# Altium footprint library Conectores GAM.PcbLib: 182 footprints (part 4 of 12)
Each footprint in its own frame and in the unit in brackets; x right, y up, seen from the top. Pads: shape width x height; smd on the part's side, far side on the other; paste and mask are expansions set on the pad; w line width, h text height; cw(c..) or ccw(c..) is an arc to the next point about the centre after c.
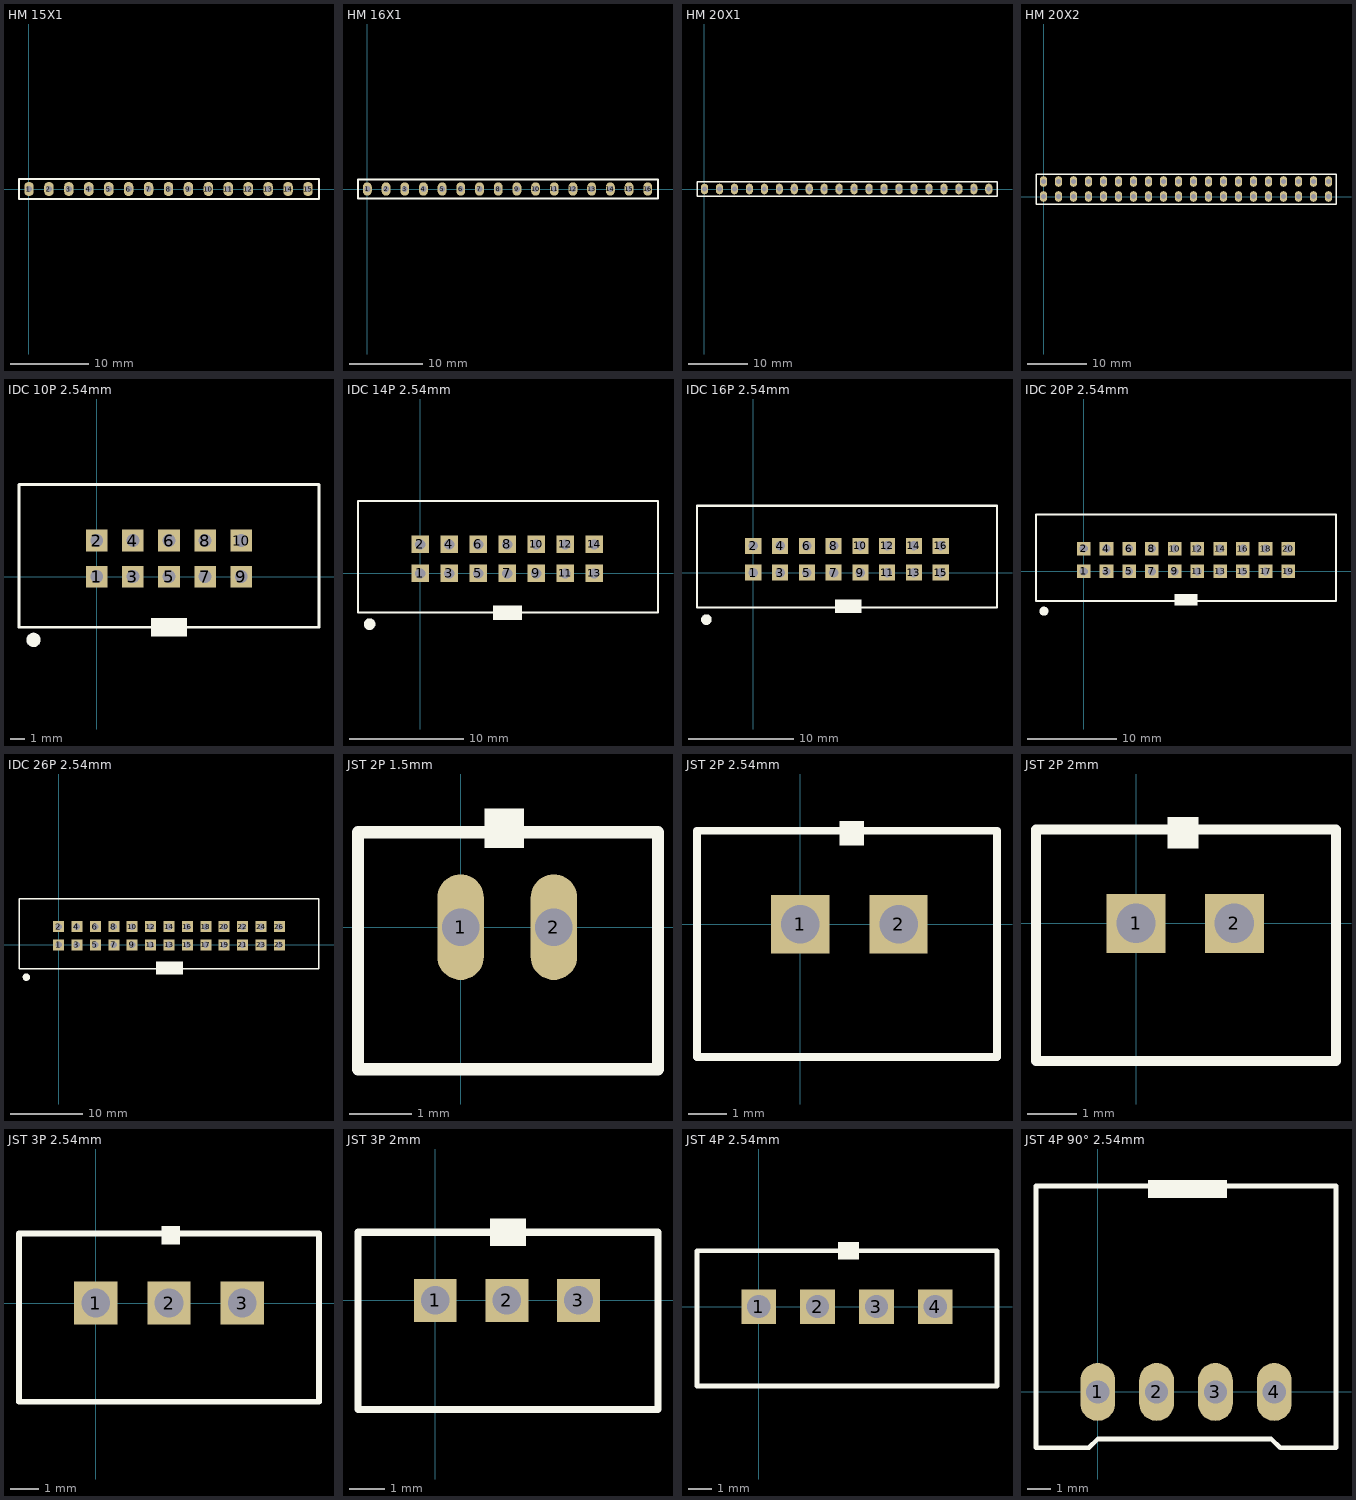
[diagram p3: the footprints below, top view; thin cyan lines are the x and y axes]

## HM 15X1 [mm] "Header Macho 15x1 2.54mm"
pads (15):
  oval 1.2x1.8 hole 0.8: 1(0,0) 2(2.54,0) 3(5.08,0) 4(7.62,0) 5(10.16,0) 6(12.7,0) 7(15.24,0) 8(17.78,0) 9(20.32,0) 10(22.86,0) 11(25.4,0) 12(27.94,0) 13(30.48,0) 14(33.02,0) 15(35.56,0)
Top Overlay:
  lines w0.254: -1.27,-1.27 -1.27,1.27 36.957,1.27 36.957,-1.27 -1.27,-1.27
3D body "Header_Male_1Pin.STEP": height 8.54, standoff -3, extent 34.29,-1.245 36.83,1.245
3D body "Header_Male_1Pin.STEP": height 8.54, standoff -3, extent 31.75,-1.245 34.29,1.245
3D body "Header_Male_1Pin.STEP": height 8.54, standoff -3, extent 29.21,-1.245 31.75,1.245
3D body "Header_Male_1Pin.STEP": height 8.54, standoff -3, extent 24.13,-1.245 26.67,1.245
3D body "Header_Male_1Pin.STEP": height 8.54, standoff -3, extent -1.27,-1.245 1.27,1.245
3D body "Header_Male_1Pin.STEP": height 8.54, standoff -3, extent 1.27,-1.245 3.81,1.245
3D body "Header_Male_1Pin.STEP": height 8.54, standoff -3, extent 3.81,-1.245 6.35,1.245
3D body "Header_Male_1Pin.STEP": height 8.54, standoff -3, extent 6.35,-1.245 8.89,1.245
3D body "Header_Male_1Pin.STEP": height 8.54, standoff -3, extent 8.89,-1.245 11.43,1.245
3D body "Header_Male_1Pin.STEP": height 8.54, standoff -3, extent 11.43,-1.245 13.97,1.245
3D body "Header_Male_1Pin.STEP": height 8.54, standoff -3, extent 13.97,-1.245 16.51,1.245
3D body "Header_Male_1Pin.STEP": height 8.54, standoff -3, extent 16.51,-1.245 19.05,1.245
3D body "Header_Male_1Pin.STEP": height 8.54, standoff -3, extent 19.05,-1.245 21.59,1.245
3D body "Header_Male_1Pin.STEP": height 8.54, standoff -3, extent 21.59,-1.245 24.13,1.245
3D body "Header_Male_1Pin.STEP": height 8.54, standoff -3, extent 26.67,-1.245 29.21,1.245

## HM 16X1 [mm] "Header Macho 16x1 2.54mm"
pads (16):
  oval 1.2x1.8 hole 0.8: 1(0,0) 2(2.54,0) 3(5.08,0) 4(7.62,0) 5(10.16,0) 6(12.7,0) 7(15.24,0) 8(17.78,0) 9(20.32,0) 10(22.86,0) 11(25.4,0) 12(27.94,0) 13(30.48,0) 14(33.02,0) 15(35.56,0) 16(38.1,0)
Top Overlay:
  lines w0.254: -1.27,-1.27 -1.27,1.27 39.497,1.27 39.497,-1.27 -1.27,-1.27
3D body "Header_Male_1Pin.STEP": height 8.54, standoff -3, extent 36.83,-1.245 39.37,1.245
3D body "Header_Male_1Pin.STEP": height 8.54, standoff -3, extent 34.29,-1.245 36.83,1.245
3D body "Header_Male_1Pin.STEP": height 8.54, standoff -3, extent 31.75,-1.245 34.29,1.245
3D body "Header_Male_1Pin.STEP": height 8.54, standoff -3, extent 29.21,-1.245 31.75,1.245
3D body "Header_Male_1Pin.STEP": height 8.54, standoff -3, extent 24.13,-1.245 26.67,1.245
3D body "Header_Male_1Pin.STEP": height 8.54, standoff -3, extent -1.27,-1.245 1.27,1.245
3D body "Header_Male_1Pin.STEP": height 8.54, standoff -3, extent 1.27,-1.245 3.81,1.245
3D body "Header_Male_1Pin.STEP": height 8.54, standoff -3, extent 3.81,-1.245 6.35,1.245
3D body "Header_Male_1Pin.STEP": height 8.54, standoff -3, extent 6.35,-1.245 8.89,1.245
3D body "Header_Male_1Pin.STEP": height 8.54, standoff -3, extent 8.89,-1.245 11.43,1.245
3D body "Header_Male_1Pin.STEP": height 8.54, standoff -3, extent 11.43,-1.245 13.97,1.245
3D body "Header_Male_1Pin.STEP": height 8.54, standoff -3, extent 13.97,-1.245 16.51,1.245
3D body "Header_Male_1Pin.STEP": height 8.54, standoff -3, extent 16.51,-1.245 19.05,1.245
3D body "Header_Male_1Pin.STEP": height 8.54, standoff -3, extent 19.05,-1.245 21.59,1.245
3D body "Header_Male_1Pin.STEP": height 8.54, standoff -3, extent 21.59,-1.245 24.13,1.245
3D body "Header_Male_1Pin.STEP": height 8.54, standoff -3, extent 26.67,-1.245 29.21,1.245

## HM 20X1 [mm] "Header Macho 20x1 2.54mm"
pads (20):
  oval 1.2x1.8 hole 0.8: 1(0,0) 2(2.54,0) 3(5.08,0) 4(7.62,0) 5(10.16,0) 6(12.7,0) 7(15.24,0) 8(17.78,0) 9(20.32,0) 10(22.86,0) 11(25.4,0) 12(27.94,0) 13(30.48,0) 14(33.02,0) 15(35.56,0) 16(38.1,0) 17(40.64,0) 18(43.18,0) 19(45.72,0) 20(48.26,0)
Top Overlay:
  lines w0.254: -1.27,-1.27 49.657,-1.27 49.657,1.27 -1.27,1.27 -1.27,-1.27
3D body "Header_Male_1Pin.STEP": height 8.54, standoff -3, extent 46.99,-1.245 49.53,1.245
3D body "Header_Male_1Pin.STEP": height 8.54, standoff -3, extent 44.45,-1.245 46.99,1.245
3D body "Header_Male_1Pin.STEP": height 8.54, standoff -3, extent 41.91,-1.245 44.45,1.245
3D body "Header_Male_1Pin.STEP": height 8.54, standoff -3, extent 39.37,-1.245 41.91,1.245
3D body "Header_Male_1Pin.STEP": height 8.54, standoff -3, extent 26.67,-1.245 29.21,1.245
3D body "Header_Male_1Pin.STEP": height 8.54, standoff -3, extent 21.59,-1.245 24.13,1.245
3D body "Header_Male_1Pin.STEP": height 8.54, standoff -3, extent 19.05,-1.245 21.59,1.245
3D body "Header_Male_1Pin.STEP": height 8.54, standoff -3, extent 16.51,-1.245 19.05,1.245
3D body "Header_Male_1Pin.STEP": height 8.54, standoff -3, extent 13.97,-1.245 16.51,1.245
3D body "Header_Male_1Pin.STEP": height 8.54, standoff -3, extent 11.43,-1.245 13.97,1.245
3D body "Header_Male_1Pin.STEP": height 8.54, standoff -3, extent 8.89,-1.245 11.43,1.245
3D body "Header_Male_1Pin.STEP": height 8.54, standoff -3, extent 6.35,-1.245 8.89,1.245
3D body "Header_Male_1Pin.STEP": height 8.54, standoff -3, extent 3.81,-1.245 6.35,1.245
3D body "Header_Male_1Pin.STEP": height 8.54, standoff -3, extent 1.27,-1.245 3.81,1.245
3D body "Header_Male_1Pin.STEP": height 8.54, standoff -3, extent -1.27,-1.245 1.27,1.245
3D body "Header_Male_1Pin.STEP": height 8.54, standoff -3, extent 24.13,-1.245 26.67,1.245
3D body "Header_Male_1Pin.STEP": height 8.54, standoff -3, extent 29.21,-1.245 31.75,1.245
3D body "Header_Male_1Pin.STEP": height 8.54, standoff -3, extent 31.75,-1.245 34.29,1.245
3D body "Header_Male_1Pin.STEP": height 8.54, standoff -3, extent 34.29,-1.245 36.83,1.245
3D body "Header_Male_1Pin.STEP": height 8.54, standoff -3, extent 36.83,-1.245 39.37,1.245

## HM 20X2 [mm] "HM 20X2 2.54mm"
pads (40):
  oval 1.2x1.8 hole 0.8: 1(0,0) 2(0,2.54) 3(2.54,0) 4(2.54,2.54) 5(5.08,0) 6(5.08,2.54) 7(7.62,0) 8(7.62,2.54) 9(10.16,0) 10(10.16,2.54) 11(12.7,0) 12(12.7,2.54) 13(15.24,0) 14(15.24,2.54) 15(17.78,0) 16(17.78,2.54) 17(20.32,0) 18(20.32,2.54) 19(22.86,0) 20(22.86,2.54) 21(25.4,0) 22(25.4,2.54) 23(27.94,0) 24(27.94,2.54) 25(30.48,0) 26(30.48,2.54) 27(33.02,0) 28(33.02,2.54) 29(35.56,0) 30(35.56,2.54) 31(38.1,0) 32(38.1,2.54) 33(40.64,0) 34(40.64,2.54) 35(43.18,0) 36(43.18,2.54) 37(45.72,0) 38(45.72,2.54) 39(48.26,0) 40(48.26,2.54)
Top Overlay:
  lines w0.254: -1.27,-1.27 -1.27,3.81 24.13,3.81 49.53,3.81 49.53,-1.27 24.13,-1.27 -1.27,-1.27
3D body "Header_Male_1Pin.STEP": height 8.54, standoff -3, extent -1.27,-1.245 1.27,1.245
3D body "Header_Male_1Pin.STEP": height 8.54, standoff -3, extent 1.27,-1.245 3.81,1.245
3D body "Header_Male_1Pin.STEP": height 8.54, standoff -3, extent 3.81,-1.245 6.35,1.245
3D body "Header_Male_1Pin.STEP": height 8.54, standoff -3, extent 6.35,-1.245 8.89,1.245
3D body "Header_Male_1Pin.STEP": height 8.54, standoff -3, extent 8.89,-1.245 11.43,1.245
3D body "Header_Male_1Pin.STEP": height 8.54, standoff -3, extent 11.43,-1.245 13.97,1.245
3D body "Header_Male_1Pin.STEP": height 8.54, standoff -3, extent 13.97,-1.245 16.51,1.245
3D body "Header_Male_1Pin.STEP": height 8.54, standoff -3, extent 16.51,-1.245 19.05,1.245
3D body "Header_Male_1Pin.STEP": height 8.54, standoff -3, extent 19.05,-1.245 21.59,1.245
3D body "Header_Male_1Pin.STEP": height 8.54, standoff -3, extent 21.59,-1.245 24.13,1.245
3D body "Header_Male_1Pin.STEP": height 8.54, standoff -3, extent 21.59,1.295 24.13,3.785
3D body "Header_Male_1Pin.STEP": height 8.54, standoff -3, extent 19.05,1.295 21.59,3.785
3D body "Header_Male_1Pin.STEP": height 8.54, standoff -3, extent 16.51,1.295 19.05,3.785
3D body "Header_Male_1Pin.STEP": height 8.54, standoff -3, extent 13.97,1.295 16.51,3.785
3D body "Header_Male_1Pin.STEP": height 8.54, standoff -3, extent 11.43,1.295 13.97,3.785
3D body "Header_Male_1Pin.STEP": height 8.54, standoff -3, extent 8.89,1.295 11.43,3.785
3D body "Header_Male_1Pin.STEP": height 8.54, standoff -3, extent 6.35,1.295 8.89,3.785
3D body "Header_Male_1Pin.STEP": height 8.54, standoff -3, extent 3.81,1.295 6.35,3.785
3D body "Header_Male_1Pin.STEP": height 8.54, standoff -3, extent 1.27,1.295 3.81,3.785
3D body "Header_Male_1Pin.STEP": height 8.54, standoff -3, extent -1.27,1.295 1.27,3.785
3D body "Header_Male_1Pin.STEP": height 8.54, standoff -3, extent 24.13,1.295 26.67,3.785
3D body "Header_Male_1Pin.STEP": height 8.54, standoff -3, extent 26.67,1.295 29.21,3.785
3D body "Header_Male_1Pin.STEP": height 8.54, standoff -3, extent 29.21,1.295 31.75,3.785
3D body "Header_Male_1Pin.STEP": height 8.54, standoff -3, extent 31.75,1.295 34.29,3.785
3D body "Header_Male_1Pin.STEP": height 8.54, standoff -3, extent 34.29,1.295 36.83,3.785
3D body "Header_Male_1Pin.STEP": height 8.54, standoff -3, extent 36.83,1.295 39.37,3.785
3D body "Header_Male_1Pin.STEP": height 8.54, standoff -3, extent 39.37,1.295 41.91,3.785
3D body "Header_Male_1Pin.STEP": height 8.54, standoff -3, extent 41.91,1.295 44.45,3.785
3D body "Header_Male_1Pin.STEP": height 8.54, standoff -3, extent 44.45,1.295 46.99,3.785
3D body "Header_Male_1Pin.STEP": height 8.54, standoff -3, extent 46.99,1.295 49.53,3.785
3D body "Header_Male_1Pin.STEP": height 8.54, standoff -3, extent 46.99,-1.245 49.53,1.245
3D body "Header_Male_1Pin.STEP": height 8.54, standoff -3, extent 44.45,-1.245 46.99,1.245
3D body "Header_Male_1Pin.STEP": height 8.54, standoff -3, extent 41.91,-1.245 44.45,1.245
3D body "Header_Male_1Pin.STEP": height 8.54, standoff -3, extent 39.37,-1.245 41.91,1.245
3D body "Header_Male_1Pin.STEP": height 8.54, standoff -3, extent 36.83,-1.245 39.37,1.245
3D body "Header_Male_1Pin.STEP": height 8.54, standoff -3, extent 34.29,-1.245 36.83,1.245
3D body "Header_Male_1Pin.STEP": height 8.54, standoff -3, extent 31.75,-1.245 34.29,1.245
3D body "Header_Male_1Pin.STEP": height 8.54, standoff -3, extent 29.21,-1.245 31.75,1.245
3D body "Header_Male_1Pin.STEP": height 8.54, standoff -3, extent 26.67,-1.245 29.21,1.245
3D body "Header_Male_1Pin.STEP": height 8.54, standoff -3, extent 24.13,-1.245 26.67,1.245

## IDC 10P 2.54mm [mil]
pads (10):
  rect 60x60 hole 35.43: 1(0,0) 2(0,100) 3(100,0) 4(100,100) 5(200,0) 6(200,100) 7(300,0) 8(300,100) 9(400,0) 10(400,100)
Top Overlay:
  circle w19.68: c-175,-175 r10
  rectangle: 150,-165 250,-115
  lines w7.87: -215,-140 615,-140 615,255 -215,255 -215,-140
3D body "BH-10.STEP": height 370.08, standoff -118.11, extent -199.61,-119.33 599.61,235

## IDC 14P 2.54mm [mil]
pads (14):
  rect 60x60 hole 35.43: 1(0,0) 2(0,100) 3(100,0) 4(100,100) 5(200,0) 6(200,100) 7(300,0) 8(300,100) 9(400,0) 10(400,100) 11(500,0) 12(500,100) 13(600,0) 14(600,100)
Top Overlay:
  circle w19.68: c-175,-175 r10
  rectangle: 250,-160 350,-110
  lines w7.87: -215,-135 820,-135 820,250 -215,250 -215,-135
3D body "BH-14.STEP": height 370.08, standoff -118.11, extent -200,-120 800,234.33

## IDC 16P 2.54mm [mil] "IDC Conector 16 Posiciones"
pads (16):
  rect 60x60 hole 35.43: 1(0,0) 2(0,100) 3(100,0) 4(100,100) 5(200,0) 6(200,100) 7(300,0) 8(300,100) 9(400,0) 10(400,100) 11(500,0) 12(500,100) 13(600,0) 14(600,100) 15(700,0) 16(700,100)
Top Overlay:
  circle w19.68: c-175,-175 r10
  rectangle: 305,-150 405,-100
  lines w7.87: -210,-130 910,-130 910,250 -210,250 -210,-130
3D body "BH-16.STEP": height 370.08, standoff -118.11, extent -199.21,-120 899.21,234.33

## IDC 20P 2.54mm [mil] "IDC Conector 20 Posiciones"
pads (20):
  rect 60x60 hole 35.43: 1(0,0) 2(0,100) 3(100,0) 4(100,100) 5(200,0) 6(200,100) 7(300,0) 8(300,100) 9(400,0) 10(400,100) 11(500,0) 12(500,100) 13(600,0) 14(600,100) 15(700,0) 16(700,100) 17(800,0) 18(800,100) 19(900,0) 20(900,100)
Top Overlay:
  circle w19.68: c-175,-175 r10
  rectangle: 400,-150 500,-100
  lines w7.87: -210,-130 -210,250 1110,250 1110,-130 -210,-130
3D body "BH-20.STEP": height 370.08, standoff -118.11, extent -199.61,-120 1099.61,234.33

## IDC 26P 2.54mm [mil] "IDC Conector 26 Posiciones"
pads (26):
  rect 60x60 hole 35.43: 1(0,0) 2(0,100) 3(100,0) 4(100,100) 5(200,0) 6(200,100) 7(300,0) 8(300,100) 9(400,0) 10(400,100) 11(500,0) 12(500,100) 13(600,0) 14(600,100) 15(700,0) 16(700,100) 17(800,0) 18(800,100) 19(900,0) 20(900,100) 21(1000,0) 22(1000,100) 23(1100,0) 24(1100,100) 25(1200,0) 26(1200,100)
Top Overlay:
  circle w19.68: c-175,-175 r10
  rectangle: 530,-160 675,-90
  lines w7.87: -215,-130 -215,250 1415,250 1415,-130 -215,-130
3D body "BH-26.STEP": height 370.08, standoff -118.11, extent -198.82,-120 1399.61,234.33

## JST 2P 1.5mm [mm] "JST Conector 1.5mm"
pads (2):
  oval 0.75x1.7 hole 0.6: 1(0,0) 2(1.5,0)
Top Overlay:
  rectangle: 0.381,1.27 1.016,1.905
  lines w0.2: -1.651,-2.286 3.175,-2.286 3.175,1.524 -1.651,1.524 -1.651,-2.286
3D body "Jst 2p 1.5mm.step": height 4.75, standoff -2.45, extent -1.488,-2.131 3.012,1.369

## JST 2P 2.54mm [mm]
pads (2):
  rect 1.5x1.5 hole 1: 1(0,0) 2(2.54,0)
Top Overlay:
  rectangle: 1.016,2.032 1.651,2.667
  lines w0.2: -2.667,-3.429 -2.667,2.413 5.08,2.413 5.08,-3.429 -2.667,-3.429
3D body "JST 2X2.54mm.step": height 7.25, standoff -3.05, extent -2.48,-3.302 5.02,2.398

## JST 2P 2mm [mm] "Conector JST 2mm"
pads (2):
  rect 1.2x1.2 hole 0.8: 1(0,0) 2(2,0)
Top Overlay:
  rectangle: 0.635,1.524 1.27,2.159
  lines w0.2: -2.032,-2.794 -2.032,1.905 4.064,1.905 4.064,-2.794 -2.032,-2.794
3D body "JST 2X2mm.step": height 6, standoff -3, extent -1.934,-2.758 3.966,1.742

## JST 3P 2.54mm [mm]
pads (3):
  rect 1.5x1.5 hole 1: 1(0,0) 2(2.54,0) 3(5.08,0)
Top Overlay:
  rectangle: 2.286,2.032 2.921,2.667
  lines w0.2: -2.667,-3.429 7.747,-3.429 7.747,2.413 -2.667,2.413 -2.667,-3.429
3D body "JST 3X2.54mm.step": height 7.25, standoff -3.05, extent -2.46,-3.414 7.54,2.286

## JST 3P 2mm [mm] "Conector JST 2mm"
pads (3):
  rect 1.2x1.2 hole 0.8: 1(0,0) 2(2,0) 3(4,0)
Top Overlay:
  rectangle: 1.524,1.524 2.54,2.286
  lines w0.2: -2.159,-3.048 -2.159,1.905 6.223,1.905 6.223,-3.048 -2.159,-3.048
3D body "JST 3P 2mm.step": height 6, standoff -3.4, extent -1.931,-2.794 5.969,1.706

## JST 4P 2.54mm [mm]
pads (4):
  rect 1.5x1.5 hole 1: 1(0,0) 2(2.54,0) 3(5.08,0) 4(7.62,0)
Top Overlay:
  rectangle: 3.429,2.032 4.318,2.794
  lines w0.2: -2.667,-3.429 10.287,-3.429 10.287,2.413 -2.667,2.413 -2.667,-3.429
3D body "JST 4X2.54mm.step": height 7.25, standoff -3.05, extent -2.44,-3.414 10.06,2.286

## JST 4P 90° 2.54mm [mm] "JST 90° 4 PIN CONNECTOR"
pads (4):
  oval 1.5x2.5 hole 1: 1(0,0) 2(2.54,0) 3(5.08,0) 4(7.62,0)
Top Overlay:
  rectangle: 2.159,8.382 5.588,9.144
  lines w0.2: -2.667,-2.413 -2.667,8.89 10.287,8.89 10.287,-2.413 7.874,-2.413 7.493,-2.032 0,-2.032 -0.381,-2.413 -2.667,-2.413
3D body "JST 4PA-XH.STEP": height 6.35, standoff -3.15, extent -2.367,-2.321 10.033,9.179